# Altium integrated library esd_library.IntLib: 989 symbols (part 1 of 6) (continued)
## Molex_22-11-2042 (continued)
CONN HEADER 4POS .100 VERT GOLD; MPN: 0022112042; PN: WM2702-ND; URL: http://www.digikey.ca/product-detail/en/0022112042/WM2702-ND
footprint MOLEX-22-11-2042 (CONN HEADER 4POS .100 VERT GOLD)
pins: 1, 2, 3, 4

## Molex_22-11-2052
designator P?
CONN HEADER 5POS .100 VERT GOLD; MPN: 0022112052; PN: WM2703-ND; URL: http://www.digikey.ca/product-detail/en/0022112052/WM2703-ND
footprint MOLEX_22-11-2052 (CONN HEADER 5POS .100 VERT GOLD)
pins: 1, 2, 3, 4, 5

## Molex_22-11-2062
designator P?
CONN HEADER 6POS .100 VERT GOLD; MPN: 0022112062; PN: WM2704-ND; URL: http://www.digikey.ca/product-detail/en/0022112062/WM2704-ND
footprint MOLEX_22-11-2062 (CONN HEADER 6POS .100 VERT GOLD)
pins: 1, 2, 3, 4, 5, 6

## Molex_22-11-2072
designator P?
CONN HEADER 7POS .100 VERT GOLD; PN: WM2705-ND; URL: http://www.digikey.ca/product-detail/en/22-11-2072/WM2705-ND; MPN: 22-11-2072
footprint MOLEX_22-11-2072 (CONN HEADER 7POS .100 VERT GOLD)
pins: 1, 2, 3, 4, 5, 6, 7

## Molex_22-11-2082
designator P?
CONN HEADER 8POS .100 VERT GOLD; MPN: 0022112082; PN: WM2706-ND; URL: http://www.digikey.ca/product-detail/en/0022112082/WM2706-ND
footprint MOLEX_22-11-2082 (CONN HEADER 8POS .100 VERT GOLD)
pins: 1, 2, 3, 4, 5, 6, 7, 8

## MOUNTING_HOLE
designator M?
Mounting Hole
footprint MOUNTING_HOLE

## Nucleo-64
designator M?
Nucleo-64 Board Model
footprint NUCLEO_64 (Nucleo 64 Placeholder)

## Res3
designator R?  value 1K
Resistor
footprint RESC2112X05M (Chip Resistor, 2-Leads, Body 2.05x1.25mm, IPC Low Density)
pins: 1, 2

## RPot
designator R?  value 10K
POT 10K OHM THUMBWHEEL CERM ST; MPN: 3352T-1-103LF; Sim Note: Enter the Resistance value and the set point into parameter fields.; Set Position: 0.5; PN: 3352T-103LF-ND; Published: 8-Jun-2000; LatestRevisionDate: 17-Jul-2002; LatestRevisionNote: Re-released for DXP Platform.; PackageReference: VR5; Publisher: Altium Limited; PackageDescription: Variable Resistor, Thru-Hole; 3 Leads; URL: http://www.digikey.ca/product-detail/en/3352T-1-103LF/3352T-103LF-ND
footprint BOURNS_3386F (Top Adjust Trimpot)
pins: 1 TOP, 2 TAP, 3 BOT
1 alternate drawing of the same symbol

## SWITCH_TACTILE
designator S?
SWITCH TACTILE SPST-NO 0.05A 12V; MPN: PTS645SH50SMTR92 LFS; PN: CKN9085CT-ND; URL: http://www.digikey.ca/product-detail/en/PTS645SH50SMTR92%20LFS/CKN9085CT-ND
footprint TACT_SWITCH_6MM_SMT
pins: 1, 2, 3, 4

## Terminal 2
designator P?
Terminal, 2-Pin; MPN: 282841-2; PN: A98342-ND; LatestRevisionDate: 17-Jul-2002; LatestRevisionNote: Re-released for DXP Platform.; Publisher: Altium Limited; URL: http://www.digikey.ca/product-detail/en/282841-2/A98342-ND/1136740
signal-integrity model Connector
footprint TYCO_282841_2
pins: 1, 2

## ULN2803A
designator U?
Eight Darlington Array; PN: ULN2803AFWGCELCT-ND; Published: 8-Jun-2000; LatestRevisionDate: 06-Jun-2005; LatestRevisionNote: Stylized 3D Model Added.; DatasheetVersion: Sep-1997; PackageReference: DIP18; Publisher: Altium Limited; PackageDescription: DIP; 18 Leads; Row Spacing 7.62 mm; Pitch 2.54 mm; ComponentLink1Description: Manufacturer Link; ComponentLink1URL: http://www.st.com/; ComponentLink2Description: Datasheet; ComponentLink2URL: http://www.st.com/stonline/products/literature/ds/1536/uln2801a.pdf; URL: http://www.digikey.ca/product-detail/en/ULN2803AFWG,C,EL/ULN2803AFWGCELCT-ND/2183710
footprint SOIC127P1030X260-18M (SOIC, 18-Leads, Body 11.51x7.50mm, Pitch 1.27mm, IPC Low Density)
pins: 1 IN1 (in), 2 IN2 (in), 3 IN3 (in), 4 IN4 (in), 5 IN5 (in), 6 IN6 (in), 7 IN7 (in), 8 IN8 (in), 9 GND (power), 10 COM D, 11 OUT8 (oc), 12 OUT7 (oc), 13 OUT6 (oc), 14 OUT5 (oc), 15 OUT4 (oc), 16 OUT3 (oc), 17 OUT2 (oc), 18 OUT1 (oc)


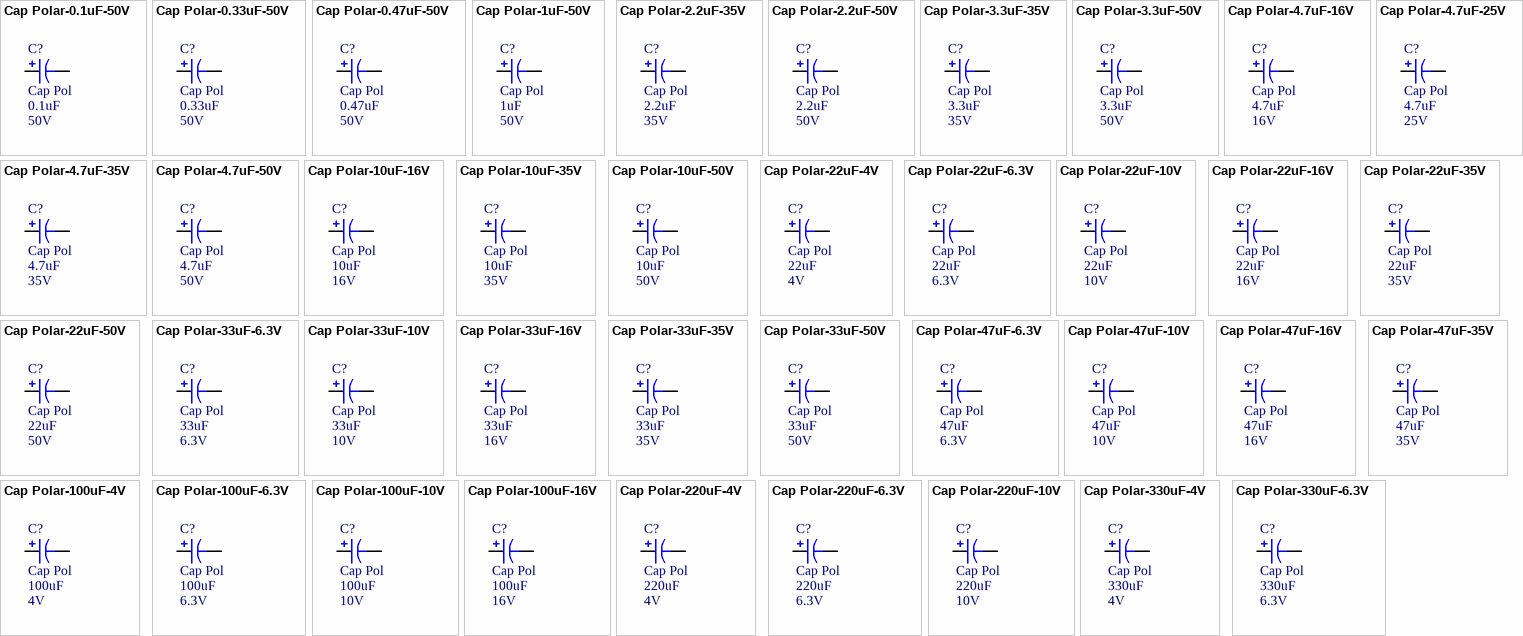
[diagram p3: symbols Cap Polar-0.1uF-50V to Cap Polar-330uF-6.3V]

## Cap Polar-0.1uF-50V
designator C?, comment Cap Pol  value 0.1uF  Voltage: 50V
CAP 85C 0.1uF ±20% 50V WX Series Aluminum Electrolytic; MPN: UWX1H0R1MCL2GB; Name: Cap Polar-0.1uF-50V; Tan Theta: 0.12; Leakage Current: 3; Rated Ripple Current: 1; PN: 493-2121-1-ND; Diameter: 3; URL: http://www.digikey.ca/product-detail/en/UWX1H0R1MCL2GB/493-2121-1-ND
footprint CAPACITOR_3MM
pins: 1, 2
1 alternate drawing of the same symbol

## Cap Polar-0.33uF-50V
designator C?, comment Cap Pol  value 0.33uF  Voltage: 50V
CAP 85C 0.33uF ±20% 50V WX Series Aluminum Electrolytic; MPN: UWX1HR33MCL2GB; Name: Cap Polar-0.33uF-50V; Tan Theta: 0.12; Leakage Current: 3; Rated Ripple Current: 2.8; PN: 493-2125-1-ND; Diameter: 3; URL: http://www.digikey.ca/product-detail/en/UWX1HR33MCL2GB/493-2125-1-ND
footprint CAPACITOR_3MM
pins: 1, 2
1 alternate drawing of the same symbol

## Cap Polar-0.47uF-50V
designator C?, comment Cap Pol  value 0.47uF  Voltage: 50V
CAP 85C 0.47uF ±20% 50V WX Series Aluminum Electrolytic; MPN: UWX1HR47MCL2GB; Name: Cap Polar-0.47uF-50V; Tan Theta: 0.12; Leakage Current: 3; Rated Ripple Current: 4; PN: 493-2127-1-ND; Diameter: 3; URL: http://www.digikey.ca/product-detail/en/UWX1HR47MCL2GB/493-2127-1-ND
footprint CAPACITOR_3MM
pins: 1, 2
1 alternate drawing of the same symbol

## Cap Polar-1uF-50V
designator C?, comment Cap Pol  value 1uF  Voltage: 50V
CAP 85C 1uF ±20% 50V WX Series Aluminum Electrolytic; MPN: UWX1H010MCL2GB; Name: Cap Polar-1uF-50V; Tan Theta: 0.12; Leakage Current: 3; Rated Ripple Current: 8; PN: 493-2129-1-ND; Diameter: 3; URL: http://www.digikey.ca/product-detail/en/UWX1H010MCL2GB/493-2129-1-ND
footprint CAPACITOR_3MM
pins: 1, 2
1 alternate drawing of the same symbol

## Cap Polar-2.2uF-35V
designator C?, comment Cap Pol  value 2.2uF  Voltage: 35V
CAP 85C 2.2uF ±20% 35V WX Series Aluminum Electrolytic; MPN: UWX1V2R2MCL2GB; Name: Cap Polar-2.2uF-35V; Tan Theta: 0.12; Leakage Current: 3; Rated Ripple Current: 8.4; PN: 493-2114-1-ND; Diameter: 3; URL: http://www.digikey.ca/product-detail/en/UWX1V2R2MCL2GB/493-2114-1-ND
footprint CAPACITOR_3MM
pins: 1, 2
1 alternate drawing of the same symbol

## Cap Polar-2.2uF-50V
designator C?, comment Cap Pol  value 2.2uF  Voltage: 50V
CAP 85C 2.2uF ±20% 50V WX Series Aluminum Electrolytic; MPN: UWX1H2R2MCL2GB; Name: Cap Polar-2.2uF-50V; Tan Theta: 0.12; Leakage Current: 3; Rated Ripple Current: 10; PN: 493-2131-1-ND; Diameter: 3; URL: http://www.digikey.ca/product-detail/en/UWX1H2R2MCL2GB/493-2131-1-ND
footprint CAPACITOR_3MM
pins: 1, 2
1 alternate drawing of the same symbol

## Cap Polar-3.3uF-35V
designator C?, comment Cap Pol  value 3.3uF  Voltage: 35V
CAP 85C 3.3uF ±20% 35V WX Series Aluminum Electrolytic; MPN: UWX1V3R3MCL2GB; Name: Cap Polar-3.3uF-35V; Tan Theta: 0.12; Leakage Current: 3; Rated Ripple Current: 10; PN: 493-2115-1-ND; Diameter: 3; URL: http://www.digikey.ca/product-detail/en/UWX1V3R3MCL2GB/493-2115-1-ND
footprint CAPACITOR_3MM
pins: 1, 2
1 alternate drawing of the same symbol

## Cap Polar-3.3uF-50V
designator C?, comment Cap Pol  value 3.3uF  Voltage: 50V
CAP 85C 3.3uF ±20% 50V WX Series Aluminum Electrolytic; MPN: UWX1H3R3MCL1GB; Name: Cap Polar-3.3uF-50V; Tan Theta: 0.12; Leakage Current: 3; Rated Ripple Current: 17; PN: 493-2133-1-ND; Diameter: 4; URL: http://www.digikey.ca/product-detail/en/UWX1H3R3MCL1GB/493-2133-1-ND
footprint CAPACITOR_4MM
pins: 1, 2
1 alternate drawing of the same symbol

## Cap Polar-4.7uF-16V
designator C?, comment Cap Pol  value 4.7uF  Voltage: 16V
CAP 85C 4.7uF ±20% 16V WX Series Aluminum Electrolytic; MPN: UWX1E4R7MCL1GB; Name: Cap Polar-4.7uF-16V; Tan Theta: 0.14; Leakage Current: 3; Rated Ripple Current: 16; PN: 493-2107-1-ND; Diameter: 4; URL: http://www.digikey.ca/product-detail/en/UWX1E4R7MCL1GB/493-2107-1-ND
footprint CAPACITOR_4MM
pins: 1, 2
1 alternate drawing of the same symbol

## Cap Polar-4.7uF-25V
designator C?, comment Cap Pol  value 4.7uF  Voltage: 25V
CAP 85C 4.7uF ±20% 25V WX Series Aluminum Electrolytic; MPN: UWX1E4R7MCL2GB; Name: Cap Polar-4.7uF-25V; Tan Theta: 0.14; Leakage Current: 3; Rated Ripple Current: 12; PN: 493-2106-1-ND; Diameter: 3; URL: http://www.digikey.ca/product-detail/en/UWX1E4R7MCL2GB/493-2106-1-ND
footprint CAPACITOR_3MM
pins: 1, 2
1 alternate drawing of the same symbol

## Cap Polar-4.7uF-35V
designator C?, comment Cap Pol  value 4.7uF  Voltage: 35V
CAP 85C 4.7uF ±20% 35V WX Series Aluminum Electrolytic; MPN: UWX1V4R7MCL1GB; Name: Cap Polar-4.7uF-35V; Tan Theta: 0.12; Leakage Current: 3; Rated Ripple Current: 18; PN: 493-2116-1-ND; Diameter: 4; URL: http://www.digikey.ca/product-detail/en/UWX1V4R7MCL1GB/493-2116-1-ND
footprint CAPACITOR_4MM
pins: 1, 2
1 alternate drawing of the same symbol

## Cap Polar-4.7uF-50V
designator C?, comment Cap Pol  value 4.7uF  Voltage: 50V
CAP 85C 4.7uF ±20% 50V WX Series Aluminum Electrolytic; MPN: UWX1H4R7MCL1GB; Name: Cap Polar-4.7uF-50V; Tan Theta: 0.12; Leakage Current: 3; Rated Ripple Current: 20; PN: 493-2134-1-ND; Diameter: 5; URL: http://www.digikey.ca/product-detail/en/UWX1H4R7MCL1GB/493-2134-1-ND
footprint CAPACITOR_5MM
pins: 1, 2
1 alternate drawing of the same symbol

## Cap Polar-10uF-16V
designator C?, comment Cap Pol  value 10uF  Voltage: 16V
CAP 85C 10uF ±20% 16V WX Series Aluminum Electrolytic; MPN: UWX1C100MCL2GB; Name: Cap Polar-10uF-16V; Tan Theta: 0.16; Leakage Current: 3; Rated Ripple Current: 18; PN: 493-2099-1-ND; Diameter: 3; URL: http://www.digikey.ca/product-detail/en/UWX1C100MCL2GB/493-2099-1-ND
footprint CAPACITOR_3MM
pins: 1, 2
1 alternate drawing of the same symbol

## Cap Polar-10uF-35V
designator C?, comment Cap Pol  value 10uF  Voltage: 35V
CAP 85C 10uF ±20% 35V WX Series Aluminum Electrolytic; MPN: UWX1V100MCL1GB; Name: Cap Polar-10uF-35V; Tan Theta: 0.12; Leakage Current: 3.5; Rated Ripple Current: 29; PN: 493-2117-1-ND; Diameter: 5; URL: http://www.digikey.ca/product-detail/en/UWX1V100MCL1GB/493-2117-1-ND
footprint CAPACITOR_5MM
pins: 1, 2
1 alternate drawing of the same symbol

## Cap Polar-10uF-50V
designator C?, comment Cap Pol  value 10uF  Voltage: 50V
CAP 85C 10uF ±20% 50V WX Series Aluminum Electrolytic; MPN: UWX1H100MCL1GB; Name: Cap Polar-10uF-50V; Tan Theta: 0.12; Leakage Current: 5; Rated Ripple Current: 33; PN: 493-2135-1-ND; Diameter: 6.3; URL: http://www.digikey.ca/product-detail/en/UWX1H100MCL1GB/493-2135-1-ND
footprint CAPACITOR_6.3MM
pins: 1, 2
1 alternate drawing of the same symbol

## Cap Polar-22uF-4V
designator C?, comment Cap Pol  value 22uF  Voltage: 4V
CAP 85C 22uF ±20% 4V WX Series Aluminum Electrolytic; MPN: UWX0G220MCL2GB; Name: Cap Polar-22uF-4V; Tan Theta: 0.35; Leakage Current: 3; Rated Ripple Current: 19; PN: 493-2075-1-ND; Diameter: 3; URL: http://www.digikey.ca/product-detail/en/UWX0G220MCL2GB/493-2075-1-ND
footprint CAPACITOR_3MM
pins: 1, 2
1 alternate drawing of the same symbol

## Cap Polar-22uF-6.3V
designator C?, comment Cap Pol  value 22uF  Voltage: 6.3V
CAP 85C 22uF ±20% 6.3V WX Series Aluminum Electrolytic; MPN: UWX0J220MCL2GB; Name: Cap Polar-22uF-6.3V; Tan Theta: 0.26; Leakage Current: 3; Rated Ripple Current: 21; PN: 493-2083-1-ND; Diameter: 3; URL: http://www.digikey.ca/product-detail/en/UWX0J220MCL2GB/493-2083-1-ND
footprint CAPACITOR_3MM
pins: 1, 2
1 alternate drawing of the same symbol

## Cap Polar-22uF-10V
designator C?, comment Cap Pol  value 22uF  Voltage: 10V
CAP 85C 22uF ±20% 10V WX Series Aluminum Electrolytic; MPN: UWX1A220MCL1GB; Name: Cap Polar-22uF-10V; Tan Theta: 0.2; Leakage Current: 3; Rated Ripple Current: 33; PN: 493-2092-1-ND; Diameter: 5; URL: http://www.digikey.ca/product-detail/en/UWX1A220MCL1GB/493-2092-1-ND
footprint CAPACITOR_5MM
pins: 1, 2
1 alternate drawing of the same symbol

## Cap Polar-22uF-16V
designator C?, comment Cap Pol  value 22uF  Voltage: 16V
CAP 85C 22uF ±20% 16V WX Series Aluminum Electrolytic; MPN: UWX1C220MCL1GB; Name: Cap Polar-22uF-16V; Tan Theta: 0.16; Leakage Current: 3.52; Rated Ripple Current: 37; PN: 493-2101-1-ND; Diameter: 5; URL: http://www.digikey.ca/product-detail/en/UWX1C220MCL1GB/493-2101-1-ND
footprint CAPACITOR_5MM
pins: 1, 2
1 alternate drawing of the same symbol

## Cap Polar-22uF-35V
designator C?, comment Cap Pol  value 22uF  Voltage: 35V
CAP 85C 22uF ±20% 35V WX Series Aluminum Electrolytic; MPN: UWX1V220MCL1GB; Name: Cap Polar-22uF-35V; Tan Theta: 0.12; Leakage Current: 7.7; Rated Ripple Current: 46; PN: 493-2118-1-ND; Diameter: 6.3; URL: http://www.digikey.ca/product-detail/en/UWX1V220MCL1GB/493-2118-1-ND
footprint CAPACITOR_6.3MM
pins: 1, 2
1 alternate drawing of the same symbol

## Cap Polar-22uF-50V
designator C?, comment Cap Pol  value 22uF  Voltage: 50V
CAP 85C 22uF ±20% 50V WX Series Aluminum Electrolytic; MPN: UWX1H220MCL1GB; Name: Cap Polar-22uF-50V; Tan Theta: 0.12; Leakage Current: 11; Rated Ripple Current: 52; PN: 493-2136-1-ND; Diameter: 8; URL: http://www.digikey.ca/product-detail/en/UWX1H220MCL1GB/493-2136-1-ND
footprint CAPACITOR_8MM
pins: 1, 2
1 alternate drawing of the same symbol

## Cap Polar-33uF-6.3V
designator C?, comment Cap Pol  value 33uF  Voltage: 6.3V
CAP 85C 33uF ±20% 6.3V WX Series Aluminum Electrolytic; MPN: UWX0J330MCL1GB; Name: Cap Polar-33uF-6.3V; Tan Theta: 0.26; Leakage Current: 3; Rated Ripple Current: 37; PN: 493-2085-1-ND; Diameter: 5; URL: http://www.digikey.ca/product-detail/en/UWX0J330MCL1GB/493-2085-1-ND
footprint CAPACITOR_5MM
pins: 1, 2
1 alternate drawing of the same symbol

## Cap Polar-33uF-10V
designator C?, comment Cap Pol  value 33uF  Voltage: 10V
CAP 85C 33uF ±20% 10V WX Series Aluminum Electrolytic; MPN: UWX1A330MCL1GB; Name: Cap Polar-33uF-10V; Tan Theta: 0.2; Leakage Current: 3.3; Rated Ripple Current: 41; PN: 493-2093-1-ND; Diameter: 5; URL: http://www.digikey.ca/product-detail/en/UWX1A330MCL1GB/493-2093-1-ND
footprint CAPACITOR_5MM
pins: 1, 2
1 alternate drawing of the same symbol

## Cap Polar-33uF-16V
designator C?, comment Cap Pol  value 33uF  Voltage: 16V
CAP 85C 33uF ±20% 16V WX Series Aluminum Electrolytic; MPN: UWX1C330MCL1GB; Name: Cap Polar-33uF-16V; Tan Theta: 0.16; Leakage Current: 5.28; Rated Ripple Current: 49; PN: 493-2102-1-ND; Diameter: 6.3; URL: http://www.digikey.ca/product-detail/en/UWX1C330MCL1GB/493-2102-1-ND
footprint CAPACITOR_6.3MM
pins: 1, 2
1 alternate drawing of the same symbol

## Cap Polar-33uF-35V
designator C?, comment Cap Pol  value 33uF  Voltage: 35V
CAP 85C 33uF ±20% 35V WX Series Aluminum Electrolytic; MPN: UWX1V330MCL1GB; Name: Cap Polar-33uF-35V; Tan Theta: 0.12; Leakage Current: 11.55; Rated Ripple Current: 62; PN: 493-2119-1-ND; Diameter: 8; URL: http://www.digikey.ca/product-detail/en/UWX1V330MCL1GB/493-2119-1-ND
footprint CAPACITOR_8MM
pins: 1, 2
1 alternate drawing of the same symbol

## Cap Polar-33uF-50V
designator C?, comment Cap Pol  value 33uF  Voltage: 50V
CAP 85C 33uF ±20% 50V WX Series Aluminum Electrolytic; MPN: UWX1H330MCL1GB; Name: Cap Polar-33uF-50V; Tan Theta: 0.12; Leakage Current: 16.5; Rated Ripple Current: 71; PN: 493-2137-1-ND; Diameter: 8; URL: http://www.digikey.ca/product-detail/en/UWX1H330MCL1GB/493-2137-1-ND
footprint CAPACITOR_8MM
pins: 1, 2
1 alternate drawing of the same symbol

## Cap Polar-47uF-6.3V
designator C?, comment Cap Pol  value 47uF  Voltage: 6.3V
CAP 85C 47uF ±20% 6.3V WX Series Aluminum Electrolytic; MPN: UWX0J470MCL1GB; Name: Cap Polar-47uF-6.3V; Tan Theta: 0.26; Leakage Current: 3; Rated Ripple Current: 45; PN: 493-2086-1-ND; Diameter: 5; URL: http://www.digikey.ca/product-detail/en/UWX0J470MCL1GB/493-2086-1-ND
footprint CAPACITOR_5MM
pins: 1, 2
1 alternate drawing of the same symbol

## Cap Polar-47uF-10V
designator C?, comment Cap Pol  value 47uF  Voltage: 10V
CAP 85C 47uF ±20% 10V WX Series Aluminum Electrolytic; MPN: UWX1A470MCL1GB; Name: Cap Polar-47uF-10V; Tan Theta: 0.2; Leakage Current: 4.7; Rated Ripple Current: 52; PN: 493-2094-1-ND; Diameter: 6.3; URL: http://www.digikey.ca/product-detail/en/UWX1A470MCL1GB/493-2094-1-ND
footprint CAPACITOR_6.3MM
pins: 1, 2
1 alternate drawing of the same symbol

## Cap Polar-47uF-16V
designator C?, comment Cap Pol  value 47uF  Voltage: 16V
CAP 85C 47uF ±20% 16V WX Series Aluminum Electrolytic; MPN: UWX1C470MCL1GB; Name: Cap Polar-47uF-16V; Tan Theta: 0.16; Leakage Current: 7.52; Rated Ripple Current: 58; PN: 493-2103-1-ND; Diameter: 6.3; URL: http://www.digikey.ca/product-detail/en/UWX1C470MCL1GB/493-2103-1-ND
footprint CAPACITOR_6.3MM
pins: 1, 2
1 alternate drawing of the same symbol

## Cap Polar-47uF-35V
designator C?, comment Cap Pol  value 47uF  Voltage: 35V
CAP 85C 47uF ±20% 35V WX Series Aluminum Electrolytic; MPN: UWX1V470MCL1GB; Name: Cap Polar-47uF-35V; Tan Theta: 0.12; Leakage Current: 16.45; Rated Ripple Current: 80; PN: 493-2120-1-ND; Diameter: 8; URL: http://www.digikey.ca/product-detail/en/UWX1V470MCL1GB/493-2120-1-ND
footprint CAPACITOR_8MM
pins: 1, 2
1 alternate drawing of the same symbol

## Cap Polar-100uF-4V
designator C?, comment Cap Pol  value 100uF  Voltage: 4V
CAP 85C 100uF ±20% 4V WX Series Aluminum Electrolytic; MPN: UWX0G101MCL1GB; Name: Cap Polar-100uF-4V; Tan Theta: 0.35; Leakage Current: 4; Rated Ripple Current: 56; PN: 493-2079-1-ND; Diameter: 5; URL: http://www.digikey.ca/product-detail/en/UWX0G101MCL1GB/493-2079-1-ND
footprint CAPACITOR_5MM
pins: 1, 2
1 alternate drawing of the same symbol

## Cap Polar-100uF-6.3V
designator C?, comment Cap Pol  value 100uF  Voltage: 6.3V
CAP 85C 100uF ±20% 6.3V WX Series Aluminum Electrolytic; MPN: UWX0J101MCL1GB; Name: Cap Polar-100uF-6.3V; Tan Theta: 0.26; Leakage Current: 6.3; Rated Ripple Current: 70; PN: 493-2088-1-ND; Diameter: 6.3; URL: http://www.digikey.ca/product-detail/en/UWX0J101MCL1GB/493-2088-1-ND
footprint CAPACITOR_6.3MM
pins: 1, 2
1 alternate drawing of the same symbol

## Cap Polar-100uF-10V
designator C?, comment Cap Pol  value 100uF  Voltage: 10V
CAP 85C 100uF ±20% 10V WX Series Aluminum Electrolytic; MPN: UWX1A101MCL1GB; Name: Cap Polar-100uF-10V; Tan Theta: 0.2; Leakage Current: 10; Rated Ripple Current: 76; PN: 493-2096-1-ND; Diameter: 6.3; URL: http://www.digikey.ca/product-detail/en/UWX1A101MCL1GB/493-2096-1-ND
footprint CAPACITOR_6.3MM
pins: 1, 2
1 alternate drawing of the same symbol

## Cap Polar-100uF-16V
designator C?, comment Cap Pol  value 100uF  Voltage: 16V
CAP 85C 100uF ±20% 16V WX Series Aluminum Electrolytic; MPN: UWX1C101MCL1GB; Name: Cap Polar-100uF-16V; Tan Theta: 0.16; Leakage Current: 16; Rated Ripple Current: 86; PN: 493-2105-1-ND; Diameter: 6.3; URL: http://www.digikey.ca/product-detail/en/UWX1C101MCL1GB/493-2105-1-ND
footprint CAPACITOR_6.3MM
pins: 1, 2
1 alternate drawing of the same symbol

## Cap Polar-220uF-4V
designator C?, comment Cap Pol  value 220uF  Voltage: 4V
CAP 85C 220uF ±20% 4V WX Series Aluminum Electrolytic; MPN: UWX0G221MCL1GB; Name: Cap Polar-220uF-4V; Tan Theta: 0.35; Leakage Current: 8.8; Rated Ripple Current: 96; PN: 493-2081-1-ND; Diameter: 6.3; URL: http://www.digikey.ca/product-detail/en/UWX0G221MCL1GB/493-2081-1-ND
footprint CAPACITOR_6.3MM
pins: 1, 2
1 alternate drawing of the same symbol

## Cap Polar-220uF-6.3V
designator C?, comment Cap Pol  value 220uF  Voltage: 6.3V
CAP 85C 220uF ±20% 6.3V WX Series Aluminum Electrolytic; MPN: UWX0J221MCL1GB; Name: Cap Polar-220uF-6.3V; Tan Theta: 0.26; Leakage Current: 13.86; Rated Ripple Current: 110; PN: 493-2090-1-ND; Diameter: 8; URL: http://www.digikey.ca/product-detail/en/UWX0J221MCL1GB/493-2090-1-ND
footprint CAPACITOR_8MM
pins: 1, 2
1 alternate drawing of the same symbol

## Cap Polar-220uF-10V
designator C?, comment Cap Pol  value 220uF  Voltage: 10V
CAP 85C 220uF ±20% 10V WX Series Aluminum Electrolytic; MPN: UWX1A221MCL1GB; Name: Cap Polar-220uF-10V; Tan Theta: 0.2; Leakage Current: 22; Rated Ripple Current: 135; PN: 493-2098-1-ND; Diameter: 8; URL: http://www.digikey.ca/product-detail/en/UWX1A221MCL1GB/493-2098-1-ND
footprint CAPACITOR_8MM
pins: 1, 2
1 alternate drawing of the same symbol

## Cap Polar-330uF-4V
designator C?, comment Cap Pol  value 330uF  Voltage: 4V
CAP 85C 330uF ±20% 4V WX Series Aluminum Electrolytic; MPN: UWX0G331MCL1GB; Name: Cap Polar-330uF-4V; Tan Theta: 0.35; Leakage Current: 13.2; Rated Ripple Current: 145; PN: 493-2082-1-ND; Diameter: 8; URL: http://www.digikey.ca/product-detail/en/UWX0G331MCL1GB/493-2082-1-ND
footprint CAPACITOR_8MM
pins: 1, 2
1 alternate drawing of the same symbol

## Cap Polar-330uF-6.3V
designator C?, comment Cap Pol  value 330uF  Voltage: 6.3V
CAP 85C 330uF ±20% 6.3V WX Series Aluminum Electrolytic; MPN: UWX0J331MCL1GB; Name: Cap Polar-330uF-6.3V; Tan Theta: 0.26; Leakage Current: 20.79; Rated Ripple Current: 170; PN: 493-2091-1-ND; Diameter: 8; URL: http://www.digikey.ca/product-detail/en/UWX0J331MCL1GB/493-2091-1-ND
footprint CAPACITOR_8MM
pins: 1, 2
1 alternate drawing of the same symbol


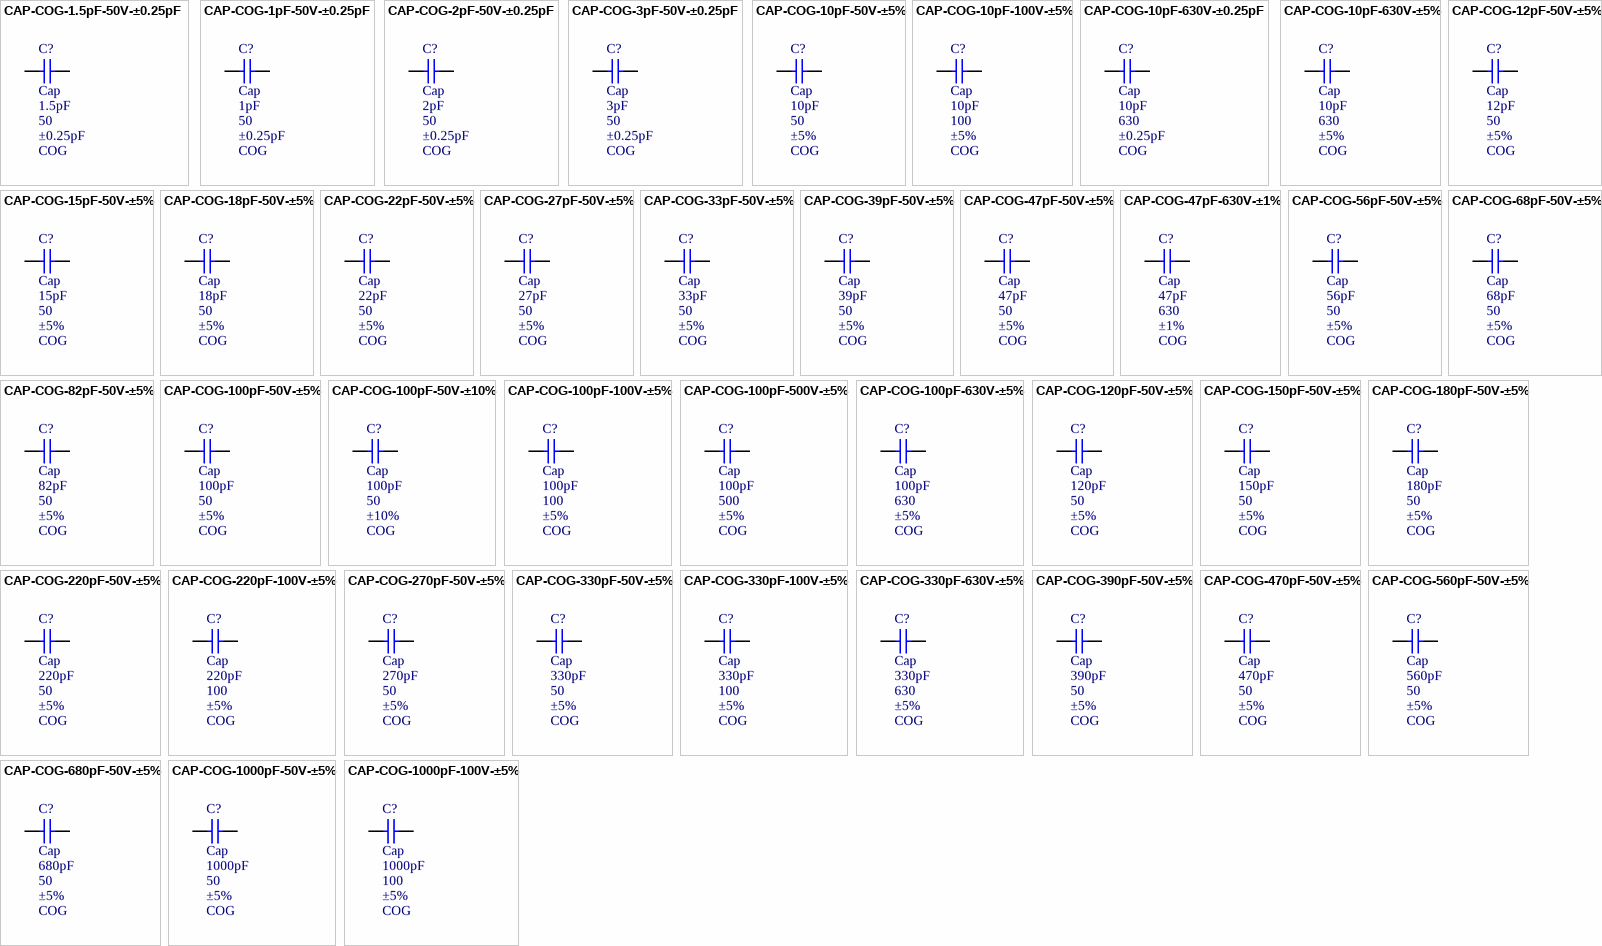
[diagram p4: symbols CAP-COG-1.5pF-50V-±0.25pF to CAP-COG-1000pF-100V-±5%]

## CAP-COG-1.5pF-50V-±0.25pF
designator C?, comment Cap  value 1.5pF  WV: 50  Tolerance: ±0.25pF  Type: COG
CAP CER 1.5pF 50v COG 0805; MPN: C0805C159C5GACTU; Name: CAP-COG-1.5pF-50V-±0.25pF; PN: 399-1105-1-ND; URL: http://www.digikey.ca/product-detail/en/C0805C159C5GACTU/399-1105-1-ND
footprint CAPC2012X09M
pins: 1, 2

## CAP-COG-1pF-50V-±0.25pF
designator C?, comment Cap  value 1pF  WV: 50  Tolerance: ±0.25pF  Type: COG
CAP CER 1pF 50v COG 0805; MPN: C0805C109C5GACTU; Name: CAP-COG-1pF-50V-±0.25pF; PN: 399-1104-1-ND; URL: http://www.digikey.ca/product-detail/en/C0805C109C5GACTU/399-1104-1-ND
footprint CAPC2012X09M
pins: 1, 2

## CAP-COG-2pF-50V-±0.25pF
designator C?, comment Cap  value 2pF  WV: 50  Tolerance: ±0.25pF  Type: COG
CAP CER 2pF 50v COG 0805; MPN: C0805C209C5GACTU; Name: CAP-COG-2pF-50V-±0.25pF; PN: 399-1106-1-ND; URL: http://www.digikey.ca/product-detail/en/C0805C209C5GACTU/399-1106-1-ND
footprint CAPC2012X09M
pins: 1, 2

## CAP-COG-3pF-50V-±0.25pF
designator C?, comment Cap  value 3pF  WV: 50  Tolerance: ±0.25pF  Type: COG
CAP CER 3pF 50v COG 0805; MPN: C0805C309C5GACTU; Name: CAP-COG-3pF-50V-±0.25pF; PN: 399-1107-1-ND; URL: http://www.digikey.ca/product-detail/en/C0805C309C5GACTU/399-1107-1-ND
footprint CAPC2012X09M
pins: 1, 2

## CAP-COG-10pF-50V-±5%
designator C?, comment Cap  value 10pF  WV: 50  Tolerance: ±5%  Type: COG
CAP CER 10pF 50v COG 0805; MPN: C0805C100J5GACTU; Name: CAP-COG-10pF-50V-±5%; PN: 399-1108-1-ND; URL: http://www.digikey.ca/product-detail/en/C0805C100J5GACTU/399-1108-1-ND
footprint CAPC2012X09M
pins: 1, 2

## CAP-COG-10pF-100V-±5%
designator C?, comment Cap  value 10pF  WV: 100  Tolerance: ±5%  Type: COG
CAP CER 10pF 100v COG 0805; MPN: C0805C100J1GACTU; Name: CAP-COG-10pF-100V-±5%; PN: 399-1109-1-ND; URL: http://www.digikey.ca/product-detail/en/C0805C100J1GACTU/399-1109-1-ND
footprint CAPC2012X09M
pins: 1, 2

## CAP-COG-10pF-630V-±0.25pF
designator C?, comment Cap  value 10pF  WV: 630  Tolerance: ±0.25pF  Type: COG
CAP CER 10pF 630v COG 0805; MPN: C0805C100CBGACTU; Name: CAP-COG-10pF-630V-±0.25pF; PN: 399-5538-1-ND; URL: http://www.digikey.ca/product-detail/en/C0805C100CBGACTU/399-5538-1-ND
footprint CAPC2012X09M
pins: 1, 2

## CAP-COG-10pF-630V-±5%
designator C?, comment Cap  value 10pF  WV: 630  Tolerance: ±5%  Type: COG
CAP CER 10pF 630v COG 0805; MPN: C0805C100JBGACTU; Name: CAP-COG-10pF-630V-±5%; PN: 399-5539-1-ND; URL: http://www.digikey.ca/product-detail/en/C0805C100JBGACTU/399-5539-1-ND
footprint CAPC2012X09M
pins: 1, 2

## CAP-COG-12pF-50V-±5%
designator C?, comment Cap  value 12pF  WV: 50  Tolerance: ±5%  Type: COG
CAP CER 12pF 50v COG 0805; MPN: C0805C120J5GACTU; Name: CAP-COG-12pF-50V-±5%; PN: 399-1110-1-ND; URL: http://www.digikey.ca/product-detail/en/C0805C120J5GACTU/399-1110-1-ND
footprint CAPC2012X09M
pins: 1, 2

## CAP-COG-15pF-50V-±5%
designator C?, comment Cap  value 15pF  WV: 50  Tolerance: ±5%  Type: COG
CAP CER 15pF 50v COG 0805; MPN: C0805C150J5GACTU; Name: CAP-COG-15pF-50V-±5%; PN: 399-1111-1-ND; URL: http://www.digikey.ca/product-detail/en/C0805C150J5GACTU/399-1111-1-ND
footprint CAPC2012X09M
pins: 1, 2

## CAP-COG-18pF-50V-±5%
designator C?, comment Cap  value 18pF  WV: 50  Tolerance: ±5%  Type: COG
CAP CER 18pF 50v COG 0805; MPN: C0805C180J5GACTU; Name: CAP-COG-18pF-50V-±5%; PN: 399-1112-1-ND; URL: http://www.digikey.ca/product-detail/en/C0805C180J5GACTU/399-1112-1-ND
footprint CAPC2012X09M
pins: 1, 2

## CAP-COG-22pF-50V-±5%
designator C?, comment Cap  value 22pF  WV: 50  Tolerance: ±5%  Type: COG
CAP CER 22pF 50v COG 0805; MPN: C0805C220J5GACTU; Name: CAP-COG-22pF-50V-±5%; PN: 399-1113-1-ND; URL: http://www.digikey.ca/product-detail/en/C0805C220J5GACTU/399-1113-1-ND
footprint CAPC2012X09M
pins: 1, 2

## CAP-COG-27pF-50V-±5%
designator C?, comment Cap  value 27pF  WV: 50  Tolerance: ±5%  Type: COG
CAP CER 27pF 50v COG 0805; MPN: C0805C270J5GACTU; Name: CAP-COG-27pF-50V-±5%; PN: 399-1114-1-ND; URL: http://www.digikey.ca/product-detail/en/C0805C270J5GACTU/399-1114-1-ND
footprint CAPC2012X09M
pins: 1, 2

## CAP-COG-33pF-50V-±5%
designator C?, comment Cap  value 33pF  WV: 50  Tolerance: ±5%  Type: COG
CAP CER 33pF 50v COG 0805; MPN: C0805C330J5GACTU; Name: CAP-COG-33pF-50V-±5%; PN: 399-1115-1-ND; URL: http://www.digikey.ca/product-detail/en/C0805C330J5GACTU/399-1115-1-ND
footprint CAPC2012X09M
pins: 1, 2

## CAP-COG-39pF-50V-±5%
designator C?, comment Cap  value 39pF  WV: 50  Tolerance: ±5%  Type: COG
CAP CER 39pF 50v COG 0805; MPN: C0805C390J5GACTU; Name: CAP-COG-39pF-50V-±5%; PN: 399-1116-1-ND; URL: http://www.digikey.ca/product-detail/en/C0805C390J5GACTU/399-1116-1-ND
footprint CAPC2012X09M
pins: 1, 2

## CAP-COG-47pF-50V-±5%
designator C?, comment Cap  value 47pF  WV: 50  Tolerance: ±5%  Type: COG
CAP CER 47pF 50v COG 0805; MPN: C0805C470J5GACTU; Name: CAP-COG-47pF-50V-±5%; PN: 399-1117-1-ND; URL: http://www.digikey.ca/product-detail/en/C0805C470J5GACTU/399-1117-1-ND
footprint CAPC2012X09M
pins: 1, 2

## CAP-COG-47pF-630V-±1%
designator C?, comment Cap  value 47pF  WV: 630  Tolerance: ±1%  Type: COG
CAP CER 47pF 630v COG 0805; MPN: C0805C470FBGACTU; Name: CAP-COG-47pF-630V-±1%; PN: 399-5537-1-ND; URL: http://www.digikey.ca/product-detail/en/C0805C470FBGACTU/399-5537-1-ND
footprint CAPC2012X09M
pins: 1, 2

## CAP-COG-56pF-50V-±5%
designator C?, comment Cap  value 56pF  WV: 50  Tolerance: ±5%  Type: COG
CAP CER 56pF 50v COG 0805; MPN: C0805C560J5GACTU; Name: CAP-COG-56pF-50V-±5%; PN: 399-1118-1-ND; URL: http://www.digikey.ca/product-detail/en/C0805C560J5GACTU/399-1118-1-ND
footprint CAPC2012X09M
pins: 1, 2

## CAP-COG-68pF-50V-±5%
designator C?, comment Cap  value 68pF  WV: 50  Tolerance: ±5%  Type: COG
CAP CER 68pF 50v COG 0805; MPN: C0805C680J5GACTU; Name: CAP-COG-68pF-50V-±5%; PN: 399-1119-1-ND; URL: http://www.digikey.ca/product-detail/en/C0805C680J5GACTU/399-1119-1-ND
footprint CAPC2012X09M
pins: 1, 2

## CAP-COG-82pF-50V-±5%
designator C?, comment Cap  value 82pF  WV: 50  Tolerance: ±5%  Type: COG
CAP CER 82pF 50v COG 0805; MPN: C0805C820J5GACTU; Name: CAP-COG-82pF-50V-±5%; PN: 399-1120-1-ND; URL: http://www.digikey.ca/product-detail/en/C0805C820J5GACTU/399-1120-1-ND
footprint CAPC2012X09M
pins: 1, 2

## CAP-COG-100pF-50V-±5%
designator C?, comment Cap  value 100pF  WV: 50  Tolerance: ±5%  Type: COG
CAP CER 100pF 50v COG 0805; MPN: C0805C101J5GACTU; Name: CAP-COG-100pF-50V-±5%; PN: 399-1122-1-ND; URL: http://www.digikey.ca/product-detail/en/C0805C101J5GACTU/399-1122-1-ND
footprint CAPC2012X09M
pins: 1, 2

## CAP-COG-100pF-50V-±10%
designator C?, comment Cap  value 100pF  WV: 50  Tolerance: ±10%  Type: COG
CAP CER 100pF 50v COG 0805; MPN: C0805C101K5GACTU; Name: CAP-COG-100pF-50V-±10%; PN: 399-1121-1-ND; URL: http://www.digikey.ca/product-detail/en/C0805C101K5GACTU/399-1121-1-ND
footprint CAPC2012X09M
pins: 1, 2

## CAP-COG-100pF-100V-±5%
designator C?, comment Cap  value 100pF  WV: 100  Tolerance: ±5%  Type: COG
CAP CER 100pF 100v COG 0805; MPN: C0805C101J1GACTU; Name: CAP-COG-100pF-100V-±5%; PN: 399-1123-1-ND; URL: http://www.digikey.ca/product-detail/en/C0805C101J1GACTU/399-1123-1-ND
footprint CAPC2012X09M
pins: 1, 2

## CAP-COG-100pF-500V-±5%
designator C?, comment Cap  value 100pF  WV: 500  Tolerance: ±5%  Type: COG
CAP CER 100pF 500v COG 0805; MPN: C0805C101JCGACTU; Name: CAP-COG-100pF-500V-±5%; PN: 399-5102-1-ND; URL: http://www.digikey.ca/product-detail/en/C0805C101JCGACTU/399-5102-1-ND
footprint CAPC2012X09M
pins: 1, 2

## CAP-COG-100pF-630V-±5%
designator C?, comment Cap  value 100pF  WV: 630  Tolerance: ±5%  Type: COG
CAP CER 100pF 630v COG 1210; MPN: C1210C101JBGACTU; Name: CAP-COG-100pF-630V-±5%; PN: 399-5546-1-ND; URL: http://www.digikey.ca/product-detail/en/C1210C101JBGACTU/399-5546-1-ND
footprint CAPC3225X25M
pins: 1, 2

## CAP-COG-120pF-50V-±5%
designator C?, comment Cap  value 120pF  WV: 50  Tolerance: ±5%  Type: COG
CAP CER 120pF 50v COG 0805; MPN: C0805C121J5GACTU; Name: CAP-COG-120pF-50V-±5%; PN: 399-1124-1-ND; URL: http://www.digikey.ca/product-detail/en/C0805C121J5GACTU/399-1124-1-ND
footprint CAPC2012X09M
pins: 1, 2

## CAP-COG-150pF-50V-±5%
designator C?, comment Cap  value 150pF  WV: 50  Tolerance: ±5%  Type: COG
CAP CER 150pF 50v COG 0805; MPN: C0805C151J5GACTU; Name: CAP-COG-150pF-50V-±5%; PN: 399-1125-1-ND; URL: http://www.digikey.ca/product-detail/en/C0805C151J5GACTU/399-1125-1-ND
footprint CAPC2012X09M
pins: 1, 2

## CAP-COG-180pF-50V-±5%
designator C?, comment Cap  value 180pF  WV: 50  Tolerance: ±5%  Type: COG
CAP CER 180pF 50v COG 0805; MPN: C0805C181J5GACTU; Name: CAP-COG-180pF-50V-±5%; PN: 399-1126-1-ND; URL: http://www.digikey.ca/product-detail/en/C0805C181J5GACTU/399-1126-1-ND
footprint CAPC2012X09M
pins: 1, 2

## CAP-COG-220pF-50V-±5%
designator C?, comment Cap  value 220pF  WV: 50  Tolerance: ±5%  Type: COG
CAP CER 220pF 50v COG 0805; MPN: C0805C221J5GACTU; Name: CAP-COG-220pF-50V-±5%; PN: 399-1127-1-ND; URL: http://www.digikey.ca/product-detail/en/C0805C221J5GACTU/399-1127-1-ND
footprint CAPC2012X09M
pins: 1, 2

## CAP-COG-220pF-100V-±5%
designator C?, comment Cap  value 220pF  WV: 100  Tolerance: ±5%  Type: COG
CAP CER 220pF 100v COG 0805; MPN: C0805C221J1GACTU; Name: CAP-COG-220pF-100V-±5%; PN: 399-1128-1-ND; URL: http://www.digikey.ca/product-detail/en/C0805C221J1GACTU/399-1128-1-ND
footprint CAPC2012X09M
pins: 1, 2

## CAP-COG-270pF-50V-±5%
designator C?, comment Cap  value 270pF  WV: 50  Tolerance: ±5%  Type: COG
CAP CER 270pF 50v COG 0805; MPN: C0805C271J5GACTU; Name: CAP-COG-270pF-50V-±5%; PN: 399-1129-1-ND; URL: http://www.digikey.ca/product-detail/en/C0805C271J5GACTU/399-1129-1-ND
footprint CAPC2012X09M
pins: 1, 2

## CAP-COG-330pF-50V-±5%
designator C?, comment Cap  value 330pF  WV: 50  Tolerance: ±5%  Type: COG
CAP CER 330pF 50v COG 0805; MPN: C0805C331J5GACTU; Name: CAP-COG-330pF-50V-±5%; PN: 399-1130-1-ND; URL: http://www.digikey.ca/product-detail/en/C0805C331J5GACTU/399-1130-1-ND
footprint CAPC2012X09M
pins: 1, 2

## CAP-COG-330pF-100V-±5%
designator C?, comment Cap  value 330pF  WV: 100  Tolerance: ±5%  Type: COG
CAP CER 330pF 100v COG 0805; MPN: C0805C331J1GACTU; Name: CAP-COG-330pF-100V-±5%; PN: 399-1131-1-ND; URL: http://www.digikey.ca/product-detail/en/C0805C331J1GACTU/399-1131-1-ND
footprint CAPC2012X09M
pins: 1, 2

## CAP-COG-330pF-630V-±5%
designator C?, comment Cap  value 330pF  WV: 630  Tolerance: ±5%  Type: COG
CAP CER 330pF 630v COG 1210; MPN: C1210C331JBGACTU; Name: CAP-COG-330pF-630V-±5%; PN: 399-5547-1-ND; URL: http://www.digikey.ca/product-detail/en/C1210C331JBGACTU/399-5547-1-ND
footprint CAPC3225X25M
pins: 1, 2

## CAP-COG-390pF-50V-±5%
designator C?, comment Cap  value 390pF  WV: 50  Tolerance: ±5%  Type: COG
CAP CER 390pF 50v COG 0805; MPN: C0805C391J5GACTU; Name: CAP-COG-390pF-50V-±5%; PN: 399-1132-1-ND; URL: http://www.digikey.ca/product-detail/en/C0805C391J5GACTU/399-1132-1-ND
footprint CAPC2012X09M
pins: 1, 2

## CAP-COG-470pF-50V-±5%
designator C?, comment Cap  value 470pF  WV: 50  Tolerance: ±5%  Type: COG
CAP CER 470pF 50v COG 0805; MPN: C0805C471J5GACTU; Name: CAP-COG-470pF-50V-±5%; PN: 399-1133-1-ND; URL: http://www.digikey.ca/product-detail/en/C0805C471J5GACTU/399-1133-1-ND
footprint CAPC2012X09M
pins: 1, 2

## CAP-COG-560pF-50V-±5%
designator C?, comment Cap  value 560pF  WV: 50  Tolerance: ±5%  Type: COG
CAP CER 560pF 50v COG 0805; MPN: C0805C561J5GACTU; Name: CAP-COG-560pF-50V-±5%; PN: 399-1134-1-ND; URL: http://www.digikey.ca/product-detail/en/C0805C561J5GACTU/399-1134-1-ND
footprint CAPC2012X09M
pins: 1, 2

## CAP-COG-680pF-50V-±5%
designator C?, comment Cap  value 680pF  WV: 50  Tolerance: ±5%  Type: COG
CAP CER 680pF 50v COG 0805; MPN: C0805C681J5GACTU; Name: CAP-COG-680pF-50V-±5%; PN: 399-1135-1-ND; URL: http://www.digikey.ca/product-detail/en/C0805C681J5GACTU/399-1135-1-ND
footprint CAPC2012X09M
pins: 1, 2

## CAP-COG-1000pF-50V-±5%
designator C?, comment Cap  value 1000pF  WV: 50  Tolerance: ±5%  Type: COG
CAP CER 1000pF 50v COG 0805; MPN: C0805C102J5GACTU; Name: CAP-COG-1000pF-50V-±5%; PN: 399-1136-1-ND; URL: http://www.digikey.ca/product-detail/en/C0805C102J5GACTU/399-1136-1-ND
footprint CAPC2012X09M
pins: 1, 2

## CAP-COG-1000pF-100V-±5%
designator C?, comment Cap  value 1000pF  WV: 100  Tolerance: ±5%  Type: COG
CAP CER 1000pF 100v COG 0805; MPN: C0805C102J1GACTU; Name: CAP-COG-1000pF-100V-±5%; PN: 399-1137-1-ND; URL: http://www.digikey.ca/product-detail/en/C0805C102J1GACTU/399-1137-1-ND
footprint CAPC2012X09M
pins: 1, 2

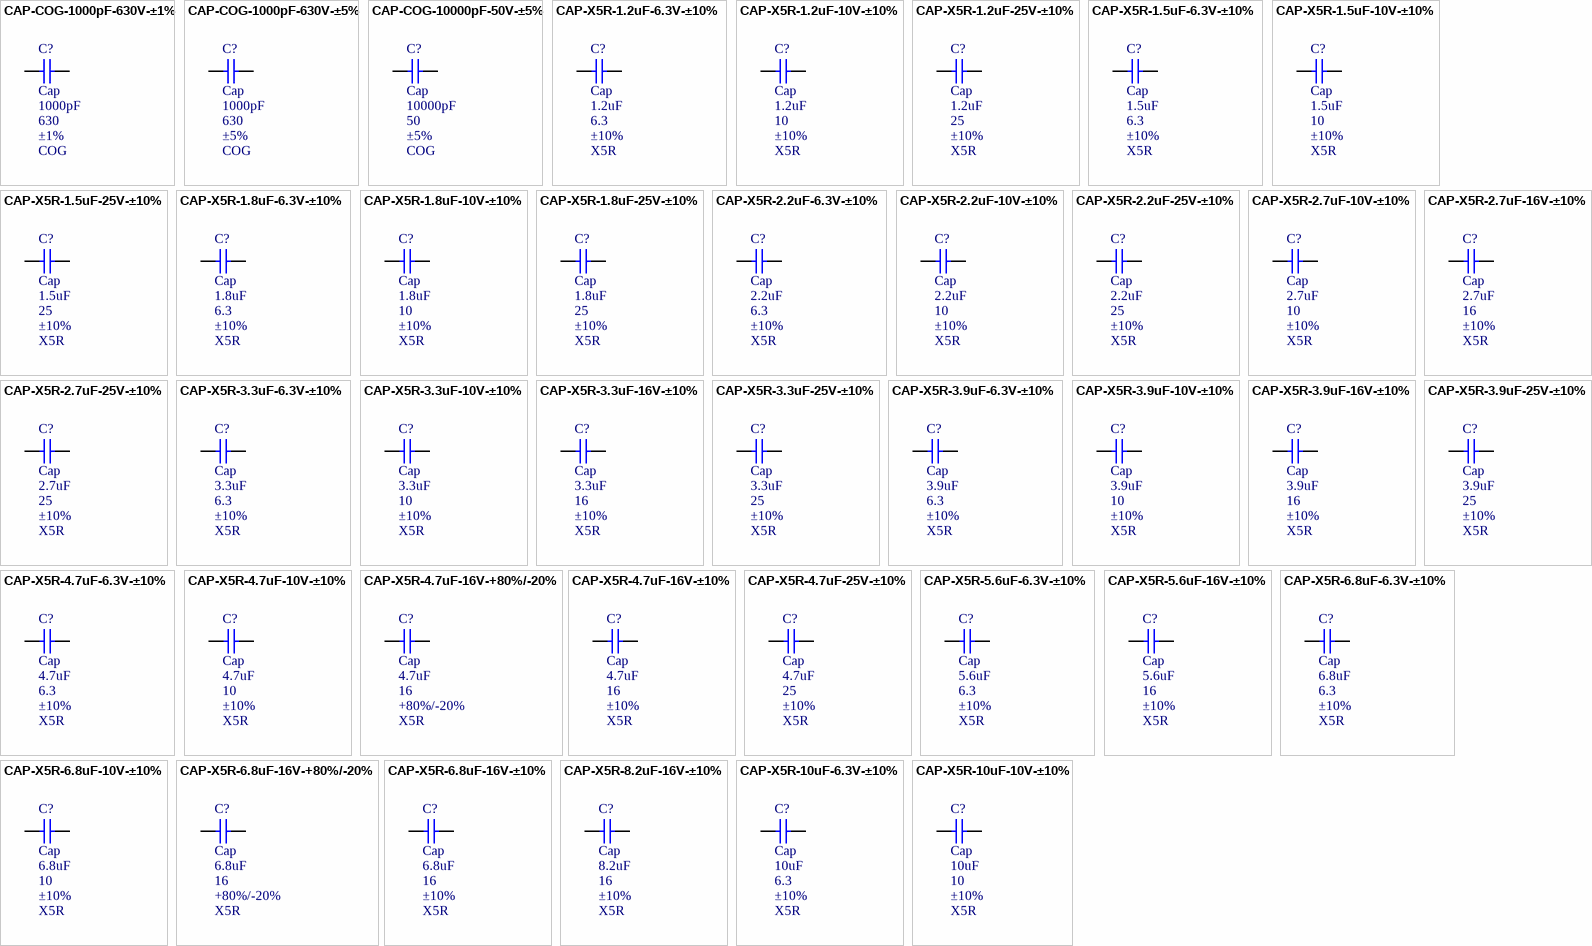
[diagram p5: symbols CAP-COG-1000pF-630V-±1% to CAP-X5R-10uF-10V-±10%]

## CAP-COG-1000pF-630V-±1%
designator C?, comment Cap  value 1000pF  WV: 630  Tolerance: ±1%  Type: COG
CAP CER 1000pF 630v COG 1210; MPN: C1210C102FBGACTU; Name: CAP-COG-1000pF-630V-±1%; PN: 399-5548-1-ND; URL: http://www.digikey.ca/product-detail/en/C1210C102FBGACTU/399-5548-1-ND
footprint CAPC3225X25M
pins: 1, 2

## CAP-COG-1000pF-630V-±5%
designator C?, comment Cap  value 1000pF  WV: 630  Tolerance: ±5%  Type: COG
CAP CER 1000pF 630v COG 1210; MPN: C1210C102JBGACTU; Name: CAP-COG-1000pF-630V-±5%; PN: 399-5549-1-ND; URL: http://www.digikey.ca/product-detail/en/C1210C102JBGACTU/399-5549-1-ND
footprint CAPC3225X25M
pins: 1, 2

## CAP-COG-10000pF-50V-±5%
designator C?, comment Cap  value 10000pF  WV: 50  Tolerance: ±5%  Type: COG
CAP CER 10000pF 50v COG 1210; MPN: C1210C103J5GACTU; Name: CAP-COG-10000pF-50V-±5%; PN: 399-1266-1-ND; URL: http://www.digikey.ca/product-detail/en/C1210C103J5GACTU/399-1266-1-ND
footprint CAPC3225X25M
pins: 1, 2

## CAP-X5R-1.2uF-6.3V-±10%
designator C?, comment Cap  value 1.2uF  WV: 6.3  Tolerance: ±10%  Type: X5R
CAP CER 1.2uF 6.3v X5R 0805; MPN: C0805C125K9PACTU; Name: CAP-X5R-1.2uF-6.3V-±10%; PN: 399-3120-1-ND; URL: http://www.digikey.ca/product-detail/en/C0805C125K9PACTU/399-3120-1-ND
footprint CAPC2012X09M
pins: 1, 2

## CAP-X5R-1.2uF-10V-±10%
designator C?, comment Cap  value 1.2uF  WV: 10  Tolerance: ±10%  Type: X5R
CAP CER 1.2uF 10v X5R 0805; MPN: C0805C125K8PACTU; Name: CAP-X5R-1.2uF-10V-±10%; PN: 399-3119-1-ND; URL: http://www.digikey.ca/product-detail/en/C0805C125K8PACTU/399-3119-1-ND
footprint CAPC2012X09M
pins: 1, 2

## CAP-X5R-1.2uF-25V-±10%
designator C?, comment Cap  value 1.2uF  WV: 25  Tolerance: ±10%  Type: X5R
CAP CER 1.2uF 25v X5R 1210; MPN: C1210C125K3PACTU; Name: CAP-X5R-1.2uF-25V-±10%; PN: 399-3077-1-ND; URL: http://www.digikey.ca/product-detail/en/C1210C125K3PACTU/399-3077-1-ND
footprint CAPC3225X25M
pins: 1, 2

## CAP-X5R-1.5uF-6.3V-±10%
designator C?, comment Cap  value 1.5uF  WV: 6.3  Tolerance: ±10%  Type: X5R
CAP CER 1.5uF 6.3v X5R 0805; MPN: C0805C155K9PACTU; Name: CAP-X5R-1.5uF-6.3V-±10%; PN: 399-3122-1-ND; URL: http://www.digikey.ca/product-detail/en/C0805C155K9PACTU/399-3122-1-ND
footprint CAPC2012X09M
pins: 1, 2

## CAP-X5R-1.5uF-10V-±10%
designator C?, comment Cap  value 1.5uF  WV: 10  Tolerance: ±10%  Type: X5R
CAP CER 1.5uF 10v X5R 0805; MPN: C0805C155K8PACTU; Name: CAP-X5R-1.5uF-10V-±10%; PN: 399-3121-1-ND; URL: http://www.digikey.ca/product-detail/en/C0805C155K8PACTU/399-3121-1-ND
footprint CAPC2012X09M
pins: 1, 2